# Altium footprint library LUMI_Handy_Soldering_LIB.PcbLib: 562 footprints (part 10 of 36)
Each footprint in its own frame and in the unit in brackets; x right, y up, seen from the top. Pads: shape width x height; smd on the part's side, far side on the other; paste and mask are expansions set on the pad; w line width, h text height; cw(c..) or ccw(c..) is an arc to the next point about the centre after c.
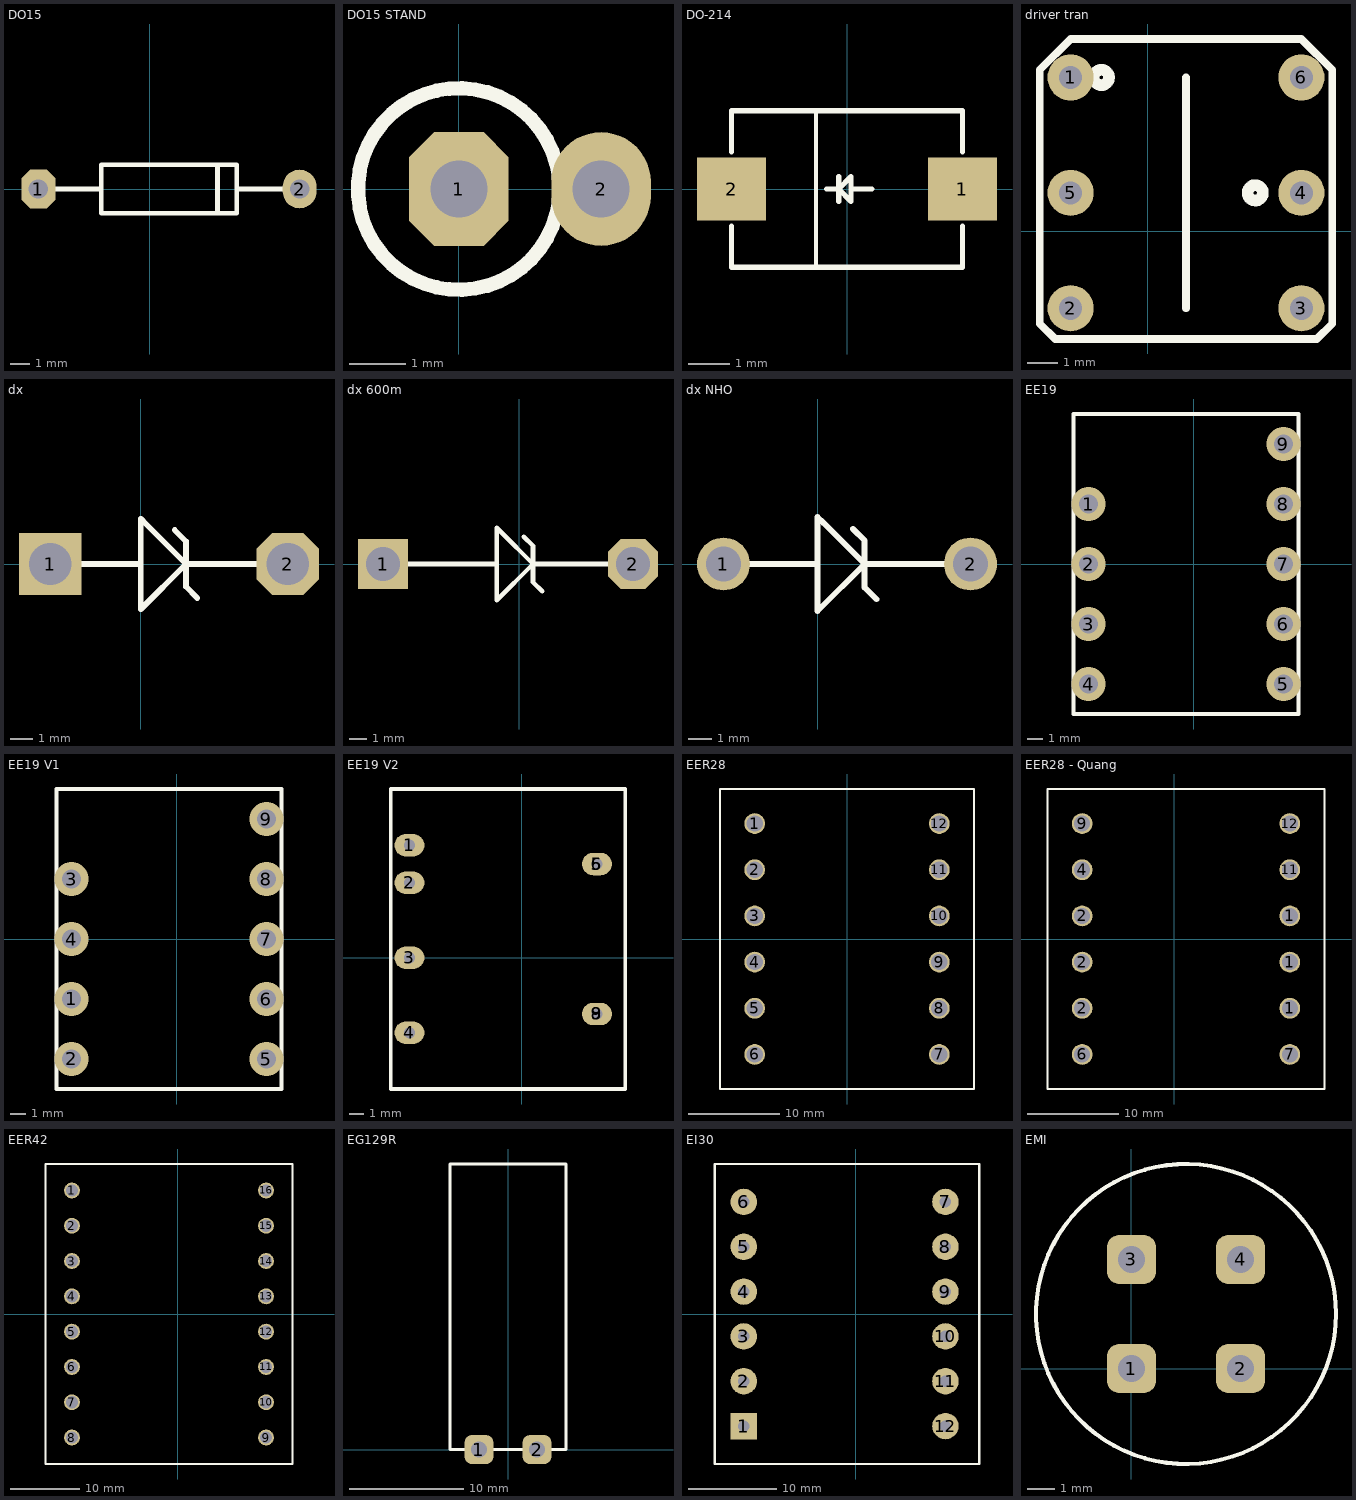
[diagram p9: the footprints below, top view; thin cyan lines are the x and y axes]

## DO15 [mil]
pads (2):
  oct 70x80 hole 40: 1(-230,0)
  oval 70x80 hole 40: 2(310,0)
Top Overlay:
  lines w10: -230,0 -100,0 ; 140,-50 140,50 ; 180,0 310,0 ; -100,-50 180,-50 180,50 -100,50 -100,-50
3D body: height 188.39, standoff -39.37, extent -244.49,-70.17 324.8,70.18

## DO15 STAND [mil]
pads (2):
  oct 70x80 hole 40: 1(0,0)
  oval 70x80 hole 40: 2(100,0)
Top Overlay:
  circle w10: c0,0 r70.87
3D body: height 435.04, standoff -157.48, extent -70.07,-70.07 116.93,70.09

## DO-214 [mm]
pads (2):
  rect 1.68x1.52 smd: 1(2.8,0) 2(-2.8,0)
Top Overlay:
  rectangle: -0.8,-1.9 -0.7,1.9
  lines w0.127: -2.8,-0.9 -2.8,-1.9 2.8,-1.9 2.8,-0.9 ; -2.8,0.9 -2.8,1.9 2.8,1.9 2.8,0.9 ; -0.5,0 -0.2,0 ; -0.2,-0.3 -0.2,0 ; -0.2,0.3 -0.2,0 ; 0.1,0 0.6,0 ; -0.2,0 0.1,-0.3 0.1,0.3 -0.2,0
3D body: height 2.3, standoff 0, extent -2.7,-1.8 2.7,1.8

## driver tran [mil]
pads (6):
  round 60 hole 30: 1(-100,200) 2(-100,-100) 3(200,-100) 4(200,50) 5(-100,50) 6(200,200)
Top Overlay:
  circle w15: c-60,200 r10
  circle w15: c140,50 r10
  region: -60,60
  region: -60,60
  region: -60,60
  region: -60,60
  region: -60,60
  region: -60,60
  region: -60,60
  lines w10: 50,-100 50,200 ; -140,-120 -140,210 -100,250 200,250 240,210 240,-120 220,-140 -120,-140 -140,-120

## dx [mil]
pads (2):
  rect 110x110 hole 75: 1(-160,0)
  oct 110x110 hole 75: 2(260,0)
Top Overlay:
  lines w10: -160,0 0,0 ; 60,60 80,40 ; 100,-60 80,-40 ; 260,0 80,0 ; 80,-40 80,40 ; 80,-40 80,40 ; 80,0 0,-80 0,70 0,80 10,70 80,0
3D body: height 105.5, standoff -95, extent -164.99,-50.49 265,50.51

## dx 600m [mil]
pads (2):
  rect 110x110 hole 75: 1(-300,0)
  oct 110x110 hole 75: 2(250,0)
Top Overlay:
  lines w10: -300,0 -50,0 ; 10,60 30,40 ; 50,-60 30,-40 ; 250,0 30,0 ; 30,-40 30,40 ; 30,-40 30,40 ; 30,0 -50,-80 -50,70 -50,80 -40,70 30,0
3D body: height 188.39, standoff -39.37, extent -308.49,-69.17 260.8,71.18

## dx NHO [mil]
pads (2):
  round 90 hole 60: 1(-160,0) 2(260,0)
Top Overlay:
  lines w10: -160,0 0,0 ; 60,60 80,40 ; 100,-60 80,-40 ; 260,0 80,0 ; 80,-40 80,40 ; 80,-40 80,40 ; 80,0 0,-80 0,70 0,80 10,70 80,0
3D body: height 105.5, standoff -95, extent -164.99,-50.49 265,50.51

## EE19 [mil]
pads (9):
  round 90 hole 50: 1(-275.59,157.48) 2(-275.59,0) 3(-275.59,-157.48) 4(-275.59,-314.96) 5(236.22,-314.96) 6(236.22,-157.48) 7(236.22,0) 8(236.22,157.48) 9(236.22,314.96)
Top Overlay:
  lines w10: -314.96,-393.7 275.59,-393.7 275.59,393.7 -314.96,393.7 -314.96,-393.7

## EE19 V1 [mil]
pads (9):
  round 90 hole 50: 1(-275.59,-157.48) 2(-275.59,-314.96) 3(-275.59,157.48) 4(-275.59,0) 5(236.22,-314.96) 6(236.22,-157.48) 7(236.22,0) 8(236.22,157.48) 9(236.22,314.96)
Top Overlay:
  lines w10: -314.96,-393.7 -314.96,393.7 275.59,393.7 275.59,-393.7 -314.96,-393.7

## EE19 V2 [mil]
pads (8):
  oval 80x60 hole 30: 1(-300,300) 2(-300,200) 3(-300,0) 4(-300,-200) 5(200,250) 6(200,250) 8(200,-150) 9(200,-150)
Top Overlay:
  lines w10: -350,-350 -350,450 275.59,450 275.59,-350 -350,-350

## EER28 [mil]
pads (12):
  round 90 hole 70: 1(-400,500) 2(-400,300) 3(-400,100) 4(-400,-100) 5(-400,-300) 6(-400,-500) 7(400,-500) 8(400,-300) 9(400,-100) 10(400,100) 11(400,300) 12(400,500)
Top Overlay:
  lines w10: -550,-650 550,-650 550,650 -550,650 -550,-650
3D body: height 847.62, standoff -170, extent -579,-730.5 591,744.51

## EER28 - Quang [mil]
pads (12):
  round 90 hole 70: 1(500,-300) 1(500,-100) 1(500,100) 2(-400,-300) 2(-400,-100) 2(-400,100) 4(-400,300) 6(-400,-500) 7(500,-500) 9(-400,500) 11(500,300) 12(500,500)
Top Overlay:
  lines w10: -550,-650 650,-650 650,650 -550,650 -550,-650
3D body: height 847.62, standoff -170, extent -535,-688.49 635,786.51

## EER42 [mil]
pads (16):
  round 90 hole 70: 1(-600,700) 2(-600,500) 3(-600,300) 4(-600,100) 5(-600,-100) 6(-600,-300) 7(-600,-500) 8(-600,-700) 9(500,-700) 10(500,-500) 11(500,-300) 12(500,-100) 13(500,100) 14(500,300) 15(500,500) 16(500,700)
Top Overlay:
  lines w10: -750,-850 -750,850 650,850 650,-850 -750,-850
3D body: height 847.62, standoff -170, extent -633,-739.49 537,735.51

## EG129R [mm]
pads (2):
  rrect50% 2.524x2.524 hole 1.4: 1(-2.54,0) 2(2.54,0)
Top Overlay:
  lines w0.254: -5.08,0 5.08,0 5.08,25 -5.08,25 -5.08,13.97 -5.08,0

## EI30 [mm]
pads (12):
  rect 3x3 hole 1.3: 1(-12.7,-12.7)
  round 3 hole 1.3: 2(-12.7,-7.62) 3(-12.7,-2.54) 4(-12.7,2.54) 5(-12.7,7.62) 6(-12.7,12.7) 7(10.16,12.7) 8(10.16,7.62) 9(10.16,2.54) 10(10.16,-2.54) 11(10.16,-7.62) 12(10.16,-12.7)
Top Overlay:
  lines w0.254: -16,-17 14,-17 14,17 -16,17 -16,-17
3D body: height 7.62, standoff -2.54, extent 9.398,11.94 10.916,13.46
3D body: height 7.62, standoff -2.54, extent 9.398,6.86 10.916,8.38
3D body: height 7.62, standoff -2.54, extent 9.398,1.78 10.916,3.3
3D body: height 7.62, standoff -2.54, extent 9.398,-3.3 10.916,-1.78
3D body: height 7.62, standoff -2.54, extent 9.398,-8.38 10.916,-6.86
3D body: height 7.62, standoff -2.54, extent 9.398,-13.46 10.916,-11.94
3D body: height 7.62, standoff -2.54, extent -13.462,-13.46 -11.944,-11.94
3D body: height 10.16, standoff 5.08, extent 5.08,-15.24 12.7,-10.16
3D body: height 10.16, standoff 5.08, extent 5.08,-10.16 12.7,-5.08
3D body: height 10.16, standoff 5.08, extent 5.08,-5.08 12.7,0
3D body: height 10.16, standoff 7.62, extent -5.715,-8.89 4.445,8.89
3D body: height 10.16, standoff 5.08, extent -15.24,10.16 -7.62,15.24
3D body: height 7.62, standoff -2.54, extent -13.456,11.94 -11.938,13.461
3D body: height 7.62, standoff -2.54, extent -13.456,6.86 -11.938,8.381
3D body: height 7.62, standoff -2.54, extent -13.456,1.78 -11.938,3.301
3D body: height 7.62, standoff -2.54, extent -13.456,-3.3 -11.938,-1.779
3D body: height 7.62, standoff -2.54, extent -13.462,-8.38 -11.944,-6.86
3D body: height 38.1, standoff 3.81, extent -5.715,8.89 4.445,13.97
3D body: height 38.1, standoff 10.16, extent -10.16,-8.872 7.55,8.872
3D body: height 7.62, standoff 1.27, extent -5.715,-13.97 4.445,13.97
3D body: height 43.18, standoff 38.1, extent -5.842,-13.97 4.318,13.97
3D body: height 38.1, standoff 3.81, extent -5.715,-13.97 4.445,-8.89
3D body: height 10.16, standoff 5.08, extent -14.922,5.08 -7.303,10.16
3D body: height 10.16, standoff 5.08, extent -15.24,0 -7.62,5.08
3D body: height 10.16, standoff 5.08, extent -15.24,-5.08 -7.62,0
3D body: height 10.16, standoff 5.08, extent -15.24,-10.16 -7.62,-5.08
3D body: height 10.16, standoff 5.08, extent -14.922,-15.24 -7.303,-10.16
3D body: height 10.16, standoff 5.08, extent 5.08,0 12.7,5.08
3D body: height 10.16, standoff 5.08, extent 5.08,5.08 12.7,10.16
3D body: height 10.16, standoff 5.08, extent 5.08,10.16 12.7,15.24
3D body: height 5.08, standoff 0, extent 4.445,-15.24 6.35,15.24
3D body: height 5.08, standoff 0, extent -7.62,-15.24 -5.715,15.24

## EMI [mm]
pads (4):
  rrect50% 1.8x1.8 hole 1: 1(0,0) 2(4,0) 3(0,4) 4(4,4)
Top Overlay:
  circle w0.15: c2,2 r5.5
3D body: height 5, standoff -5, extent 3.603,3.601 4.4,4.399
3D body: height 5, standoff -5, extent -0.397,3.601 0.4,4.399
3D body: height 5, standoff -5, extent -0.397,-0.399 0.4,0.399
3D body: height 5, standoff -5, extent 3.603,-0.399 4.4,0.399
3D body: height 10, standoff 0, extent -3.457,-3.478 7.5,7.5